# Altium footprint library 15-LEDs+LCD.PcbLib: 116 footprints (part 3 of 8)
Each footprint in its own frame and in the unit in brackets; x right, y up, seen from the top. Pads: shape width x height; smd on the part's side, far side on the other; paste and mask are expansions set on the pad; w line width, h text height; cw(c..) or ccw(c..) is an arc to the next point about the centre after c.
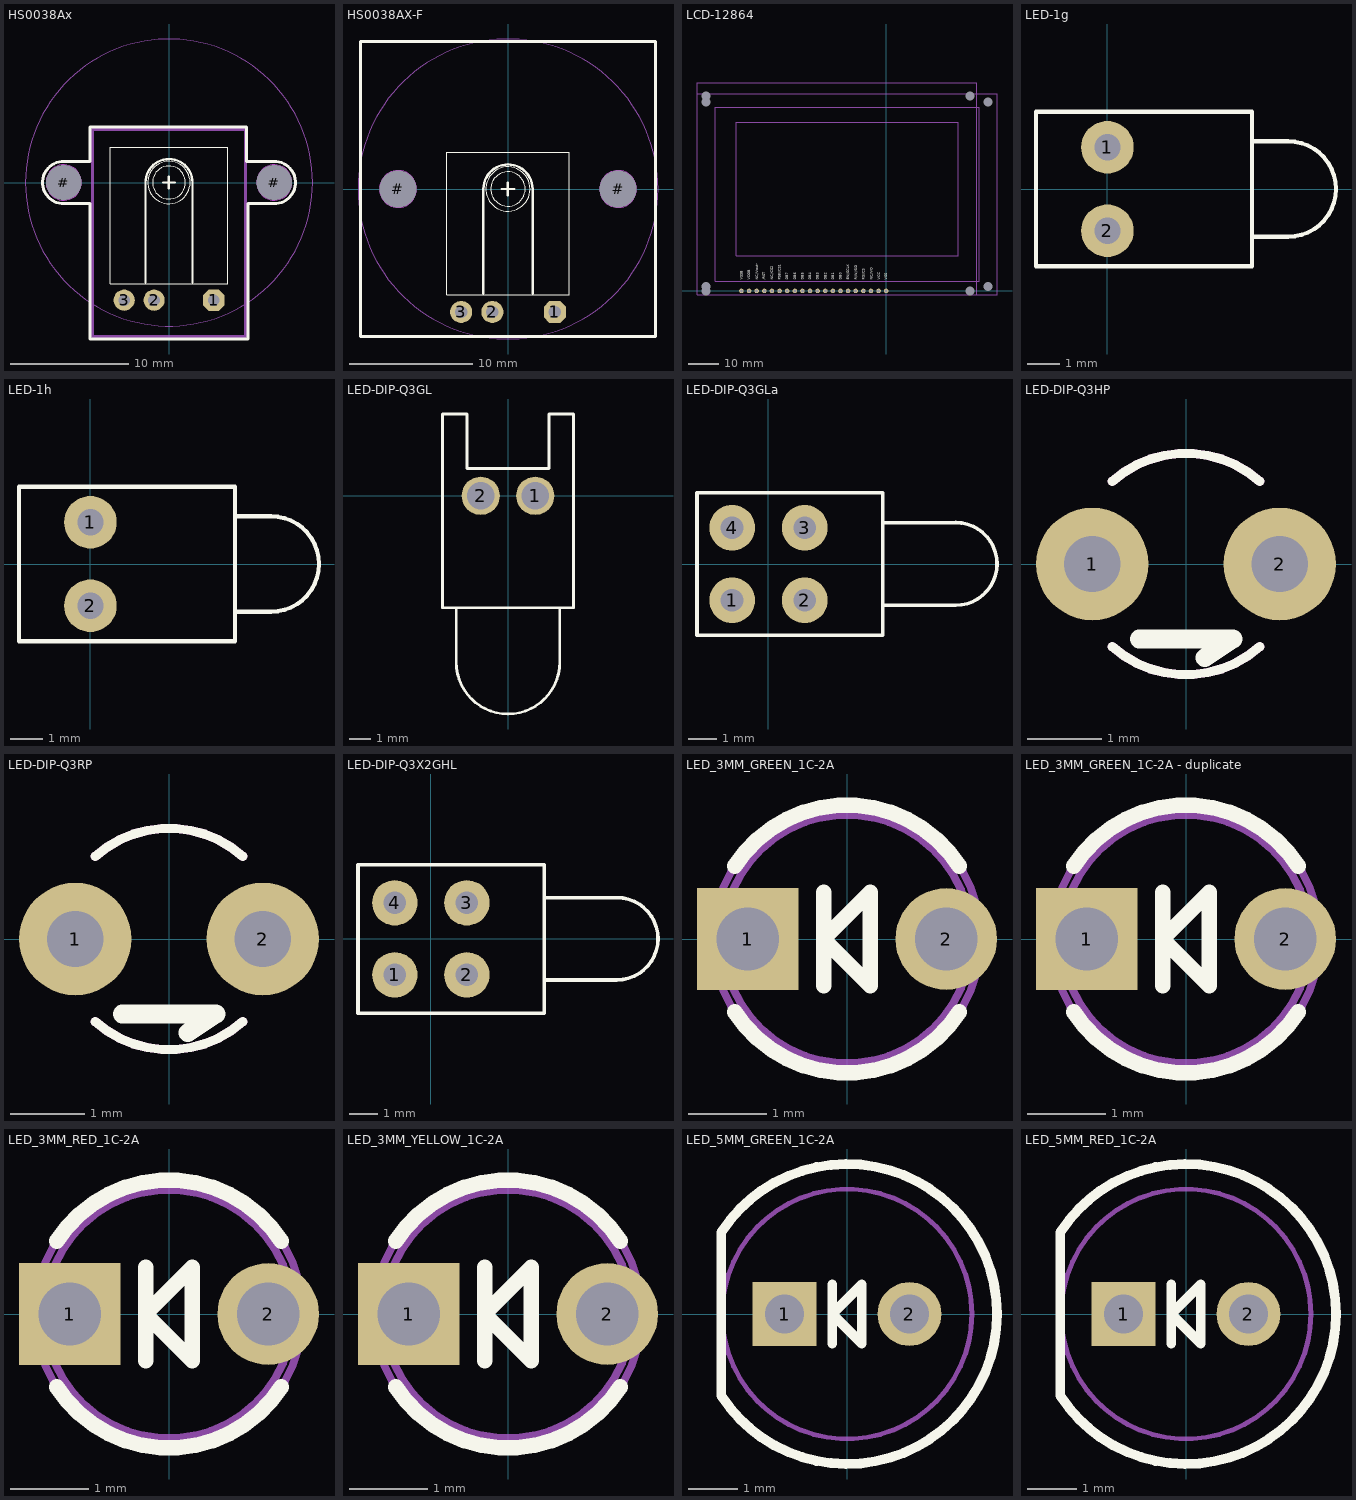
[diagram p2: the footprints below, top view; thin cyan lines are the x and y axes]

## HS0038Ax [mm]
height 12.8
pads (5):
  oct 1.8x1.8 hole 1: 1(3.81,-10)
  round 1.8 hole 1: 2(-1.27,-10) 3(-3.81,-10)
  round 1.5 hole 3: #(-8.95,0) #(8.95,0)
Top Overlay:
  circle w0.001: c0,0 r1.4
  circle w0.001: c0,0 r1.8
  lines w0.01: -5,-8.6 5,-8.6 5,3 -5,3 -5,-8.6
  lines w0.2: -2,-8.5 -2,0 cw(c0,0) 2,0 2,-8.5
  lines w0.203: -0.5,0 0.5,0 ; -0.01,-0.51 -0.01,0.49
  lines w0.254: 8.9,-1.8 6.7,-1.8 6.7,-13.3 -6.731,-13.3 -6.731,-1.8 -8.9,-1.8 cw(c-8.95,0) -8.903,1.799 -6.7,1.799 -6.7,4.7 6.6,4.7 6.6,1.8 9,1.8 ; 8.9,1.799 cw(c8.95,0) 8.903,-1.799
Keep-Out Layer:
  circle w0.025: c8.95,0 r1.5
  circle w0.025: c-8.95,0 r1.5
Mechanical 1:
  circle w0.025: c-8.95,0 r1.5
  circle w0.025: c8.95,0 r1.5
Mechanical 15:
  circle w0.001: c0,0 r12.2
  lines w0.254: -6.5,-13.1 6.5,-13.1 6.5,4.5 -6.5,4.5 -6.5,-13.1
3D body "hs0038.stp": height 5.8, standoff -2.78, extent -5,-11.625 5,3.65
3D body "irled-cover.stp": height 18.05, standoff -3, extent -10.1,-13.05 10.1,4.45

## HS0038AX-F [mm]
height 12.8
pads (5):
  oct 1.8x1.8 hole 1: 1(3.81,-10)
  round 1.8 hole 1: 2(-1.27,-10) 3(-3.81,-10)
  round 1.5 hole 3: #(-8.95,0) #(8.95,0)
Top Overlay:
  circle w0.001: c0,0 r1.4
  circle w0.001: c0,0 r1.8
  lines w0.01: -5,-8.6 5,-8.6 5,3 -5,3 -5,-8.6
  lines w0.2: -2,-8.5 -2,0 cw(c0,0) 2,0 2,-8.5
  lines w0.203: -0.5,0 0.5,0 ; -0.01,-0.51 -0.01,0.49
  lines w0.254: -12,-12 12,-12 12,12 -12,12 -12,-12
Keep-Out Layer:
  circle w0.025: c8.95,0 r1.5
  circle w0.025: c-8.95,0 r1.5
Mechanical 1:
  circle w0.025: c-8.95,0 r1.5
  circle w0.025: c8.95,0 r1.5
Mechanical 15:
  circle w0.001: c0,0 r12.2
3D body "hs0038.stp": height 5.8, standoff -2.78, extent -5,-10.45 5,3.25
3D body "xrb-fledz.stp": height 22.8, standoff 0, extent -12,-12 12,12

## LCD-12864 [mil] "HD35-12864 & 显白"
height 334.65
pads (28):
  round 60 hole 39.37: 1(0,0) 2(-100,0) 3(-200,0) 4(-300,0) 5(-400,0) 6(-500,0) 7(-600,0) 8(-700,0) 9(-800,0) 10(-899.21,0) 11(-1000,0) 12(-1100,0) 13(-1200,0) 14(-1300,0) 15(-1400,0) 16(-1500,0) 17(-1600,0) 18(-1700,0) 19(-1800,0) 20(-1900,0)
  round 60 hole 118.11: #(-2364.57,61.02) #(-2364.57,2482.28) #(-2364.57,2561.02) #(-2364.57,0) #(1100,0) #(1100,2561.02) #(1336.22,61.02) #(1336.22,2482.28)
Top Overlay:
  text "VSS" at 14.5,146.5 h35.43
  text "VCC" at -79.5,144.5 h35.43
  text "NC//VO" at -179.5,146.5 h35.43
  text "RS//CS" at -281.5,146.5 h35.43
  text "R/W//SID" at -382.5,146.5 h35.43
  text "EN//SCLK" at -482.5,146.5 h35.43
  text "DB0" at -583.5,146.5 h35.43
  text "DB1" at -683.5,146.5 h35.43
  text "DB2" at -783.5,146.5 h35.43
  text "DB3" at -885.5,146.5 h35.43
  text "DB4" at -984.5,146.5 h35.43
  text "DB5" at -1085.5,146.5 h35.43
  text "DB6" at -1183.5,146.5 h35.43
  text "DB7" at -1282.5,146.5 h35.43
  text "PSB//CS1" at -1383.5,146.5 h35.43
  text "NC//CS2" at -1483.5,146.5 h35.43
  text "/RST" at -1584.5,146.5 h35.43
  text "NC//Vout-" at -1682.5,146.5 h35.43
  text "VDDB" at -1782.5,146.5 h35.43
  text "VSSB" at -1880.5,146.5 h35.43
Mechanical 13:
  lines w0.39: -2246.46,126.65 1218.11,126.65 1218.11,2410.12 -2246.46,2410.12 -2246.46,126.65 ; -1970.87,460 942.52,460 942.52,2213.27 -1970.87,2213.27 -1970.87,460
  lines w5: -2483.17,2590.55 1453.5,2590.55 ; -2482.68,2590.55 -2482.68,-47.24 1454.33,-47.24 1454.33,2590.5
Mechanical 15:
  lines w10: -2483.5,2735.5 1190.5,2735.5 1190.5,-47.24 -2482.68,-47.24 -2482.68,2735.5
3D body "lcd-12864.stp": height 511.81, standoff 92.52, extent -2483.5,-47.5 1453.5,2590.29

## LED-1g [mm]
height 12.8
pads (2):
  round 1.6 hole 0.8: 1(0,1.27)
  round 1.6 hole 0.8 mask+0.07: 2(0,-1.27)
Top Overlay:
  lines w0.127: 4.4,-1.45 5.5,-1.45 ccw(c5.5,0) 5.5,1.45 4.4,1.45 ; -2.172,-2.349 4.4,-2.349 4.4,2.349 -2.172,2.349 -2.172,-2.349
3D body "f3ledzg.stp": height 7.55, standoff -3.19, extent -2.057,-2.237 7.173,2.263

## LED-1h [mm] "Typical RED GaAs LED; 2 Leads"
height 12.8
pads (2):
  round 1.6 hole 0.8 mask+0.07: 1(0,1.27) 2(0,-1.27)
Top Overlay:
  lines w0.127: 4.4,-1.45 5.5,-1.45 ccw(c5.5,0) 5.5,1.45 4.4,1.45 ; -2.172,-2.349 4.4,-2.349 4.4,2.349 -2.172,2.349 -2.172,-2.349
3D body "f3ledzh.stp": height 7.55, standoff -3.19, extent -2.056,-2.25 7.174,2.25

## LED-DIP-Q3GL [mil] "Typical INFRARED GaAs LED; 2 Leads"
height 503.94
pads (2):
  round 70 hole 50: 1(50,0)
  round 70 hole 50 mask+2.76: 2(-50,0)
Top Overlay:
  lines w5: -95,-205 -95,-305 ccw(c0,-305) 95,-305 95,-205 ; -120,-205 120,-205 120,150 75,150 75,50 -75,50 -75,150 -120,150 -120,-205
3D body "f3ledzg.stp": height 297.24, standoff -125.59, extent -88.58,-270.43 88.58,92.95

## LED-DIP-Q3GLa [mm]
height 12.8
pads (4):
  round 1.6 hole 0.8 mask+0.07: 1(-1.27,-1.27) 2(1.27,-1.27) 4(-1.27,1.27)
  round 1.6 hole 0.8: 3(1.27,1.27)
Top Overlay:
  lines w0.127: 4,-1.45 6.553,-1.45 ; 4,1.45 6.553,1.45 ; 6.553,-1.448 ccw(c6.553,0.002) 6.553,1.452 ; -2.5,-2.5 -2.5,2.5 4,2.5 4,-2.5 -2.5,-2.5
3D body "f3ledzg.stp": height 7.55, standoff -3.19, extent -2.057,-2.237 7.173,2.263

## LED-DIP-Q3HP [mil]
height 503.94
pads (2):
  round 60 hole 30: 1(-50,0) 2(50,0)
Top Overlay:
  lines w10: -25,-40 25,-40 10,-50
Top Overlay keep-out:
  lines w5: -39.23,-44.14 ccw(c0,0) 39.23,-44.14 ; -39.23,44.14 cw(c0,0) 39.23,44.14
3D body "led-q3h.stp": height 519.68, standoff -118.11, extent -59.84,-59.05 59.85,59.06

## LED-DIP-Q3RP [mil]
height 503.94
pads (2):
  round 60 hole 30: 1(-50,0) 2(50,0)
Top Overlay:
  lines w10: -25,-40 25,-40 10,-50
Top Overlay keep-out:
  lines w5: -39.23,-44.14 ccw(c0,0) 39.23,-44.14 ; -39.23,44.14 cw(c0,0) 39.23,44.14
3D body "led-q3r.stp": height 519.68, standoff -118.11, extent -59.84,-59.05 59.85,59.06

## LED-DIP-Q3X2GHL [mm]
height 12.8
pads (4):
  round 1.6 hole 0.8 mask+0.07: 1(-1.27,-1.27) 2(1.27,-1.27) 4(-1.27,1.27)
  round 1.6 hole 0.8: 3(1.27,1.27)
Top Overlay:
  lines w0.127: 4,-1.45 6.553,-1.45 ; 4,1.45 6.553,1.45 ; 6.553,-1.448 ccw(c6.553,0.002) 6.553,1.452 ; -2.565,-2.629 -2.565,2.616 4,2.616 4,-2.629 -2.565,-2.629
3D body "led_gh_rs.stp": height 10.2, standoff -3.2, extent -2.45,-2.5 8.05,2.5

## LED_3MM_GREEN_1C-2A [mm] "LED, Green, Body Dia. 3.43 mm, Pin spacing 2.54mm"
height 6.35
pads (2):
  rect 1.3x1.3 hole 0.8: 1(-1.27,0)
  round 1.3 hole 0.8: 2(1.27,0)
Top Overlay:
  lines w0.2: -1.438,-0.934 ccw(c0,0) 1.438,-0.934 ; -1.438,0.934 cw(c0,0) 1.438,0.934 ; -0.3,-0.6 -0.3,0.6 ; -0.3,0 0.3,-0.6 0.3,0.6 -0.3,0
Mechanical 14:
  circle w0.1: c0,0 r1.59
  circle w0.1: c0,0 r1.715
  lines w0.1: -0.3,-0.6 -0.3,0.6 ; -0.3,0 0.3,0.6 0.3,-0.6 -0.3,0
3D body "LED_3MM_GREEN_v.stp": height 9.85, standoff -3.5, extent -1.715,-1.715 1.715,1.715

## LED_3MM_GREEN_1C-2A - duplicate [mm] "LED, Green, Body Dia. 3.43 mm, Pin spacing 2.54mm"
height 6.35
pads (2):
  rect 1.3x1.3 hole 0.8: 1(-1.27,0)
  round 1.3 hole 0.8: 2(1.27,0)
Top Overlay:
  lines w0.2: -1.438,-0.934 ccw(c0,0) 1.438,-0.934 ; -1.438,0.934 cw(c0,0) 1.438,0.934 ; -0.3,-0.6 -0.3,0.6 ; -0.3,0 0.3,0.6 0.3,-0.6 -0.3,0
Mechanical 14:
  circle w0.1: c0,0 r1.715
  circle w0.1: c0,0 r1.59
  lines w0.1: -0.3,-0.6 -0.3,0.6 ; -0.3,0 0.3,-0.6 0.3,0.6 -0.3,0
3D body "LED_3MM_GREEN_v.stp": height 9.85, standoff -3.5, extent -1.715,-1.715 1.715,1.715

## LED_3MM_RED_1C-2A [mm] "LED, Red, Body Dia. 3.43 mm, Pin spacing 2.54mm"
height 6.35
pads (2):
  rect 1.3x1.3 hole 0.8: 1(-1.27,0)
  round 1.3 hole 0.8: 2(1.27,0)
Top Overlay:
  lines w0.2: -1.438,-0.934 ccw(c0,0) 1.438,-0.934 ; -1.438,0.934 cw(c0,0) 1.438,0.934 ; -0.3,-0.6 -0.3,0.6 ; -0.3,0 0.3,-0.6 0.3,0.6 -0.3,0
Mechanical 14:
  circle w0.1: c0,0 r1.59
  circle w0.1: c0,0 r1.715
  lines w0.1: -0.3,-0.6 -0.3,0.6 ; -0.3,0 0.3,-0.6 0.3,0.6 -0.3,0
3D body "LED_3MM_RED_v.stp": height 9.85, standoff -3.5, extent -1.715,-1.715 1.715,1.715

## LED_3MM_YELLOW_1C-2A [mm] "LED, Red, Body Dia. 3.43 mm, Pin spacing 2.54mm"
height 6.35
pads (2):
  rect 1.3x1.3 hole 0.8: 1(-1.27,0)
  round 1.3 hole 0.8: 2(1.27,0)
Top Overlay:
  lines w0.2: -1.438,-0.934 ccw(c0,0) 1.438,-0.934 ; -1.438,0.934 cw(c0,0) 1.438,0.934 ; -0.3,-0.6 -0.3,0.6 ; -0.3,0 0.3,0.6 0.3,-0.6 -0.3,0
Mechanical 14:
  circle w0.1: c0,0 r1.715
  circle w0.1: c0,0 r1.59
  lines w0.1: -0.3,-0.6 -0.3,0.6 ; -0.3,0 0.3,0.6 0.3,-0.6 -0.3,0
3D body "LED_3MM_YELLOW_v.stp": height 9.85, standoff -3.5, extent -1.715,-1.715 1.715,1.715

## LED_5MM_GREEN_1C-2A [mm] "LED, Green, Body Dia. 5.08mm, Pin spacing 2.54mm"
height 9.19
pads (2):
  rect 1.3x1.3 hole 0.8: 1(-1.27,0)
  round 1.3 hole 0.8: 2(1.27,0)
Top Overlay:
  lines w0.2: -0.3,-0.6 -0.3,0.6 ; -2.558,-1.661 ccw(c0,0) -2.558,1.661 -2.558,-1.661 ; -0.3,0 0.3,-0.6 0.3,0.6 -0.3,0
Mechanical 14:
  circle w0.1: c0,0 r2.54
  lines w0.1: -0.3,-0.6 -0.3,0.6 ; -2.529,-1.706 ccw(c0,0) -2.529,1.706 -2.529,-1.706 ; -0.3,0 0.3,0.6 0.3,-0.6 -0.3,0
3D body "LED_5MM_GREEN_v.stp": height 14.32, standoff -3.5, extent -2.54,-3.048 3.05,3.048

## LED_5MM_RED_1C-2A [mm] "LED, Red, Body Dia. 5.08mm, Pin spacing 2.54mm"
height 9.19
pads (2):
  rect 1.3x1.3 hole 0.8: 1(-1.27,0)
  round 1.3 hole 0.8: 2(1.27,0)
Top Overlay:
  lines w0.2: -0.3,-0.6 -0.3,0.6 ; -2.558,-1.661 ccw(c0,0) -2.558,1.661 -2.558,-1.661 ; -0.3,0 0.3,0.6 0.3,-0.6 -0.3,0
Mechanical 14:
  circle w0.1: c0,0 r2.54
  lines w0.1: -0.3,-0.6 -0.3,0.6 ; -2.529,-1.706 ccw(c0,0) -2.529,1.706 -2.529,-1.706 ; -0.3,0 0.3,-0.6 0.3,0.6 -0.3,0
3D body "LED_5MM_RED_v.stp": height 14.32, standoff -3.5, extent -2.54,-3.048 3.05,3.048